# Altium footprint library pcb.PcbLib: 397 footprints (part 8 of 25)
Each footprint in its own frame and in the unit in brackets; x right, y up, seen from the top. Pads: shape width x height; smd on the part's side, far side on the other; paste and mask are expansions set on the pad; w line width, h text height; cw(c..) or ccw(c..) is an arc to the next point about the centre after c.
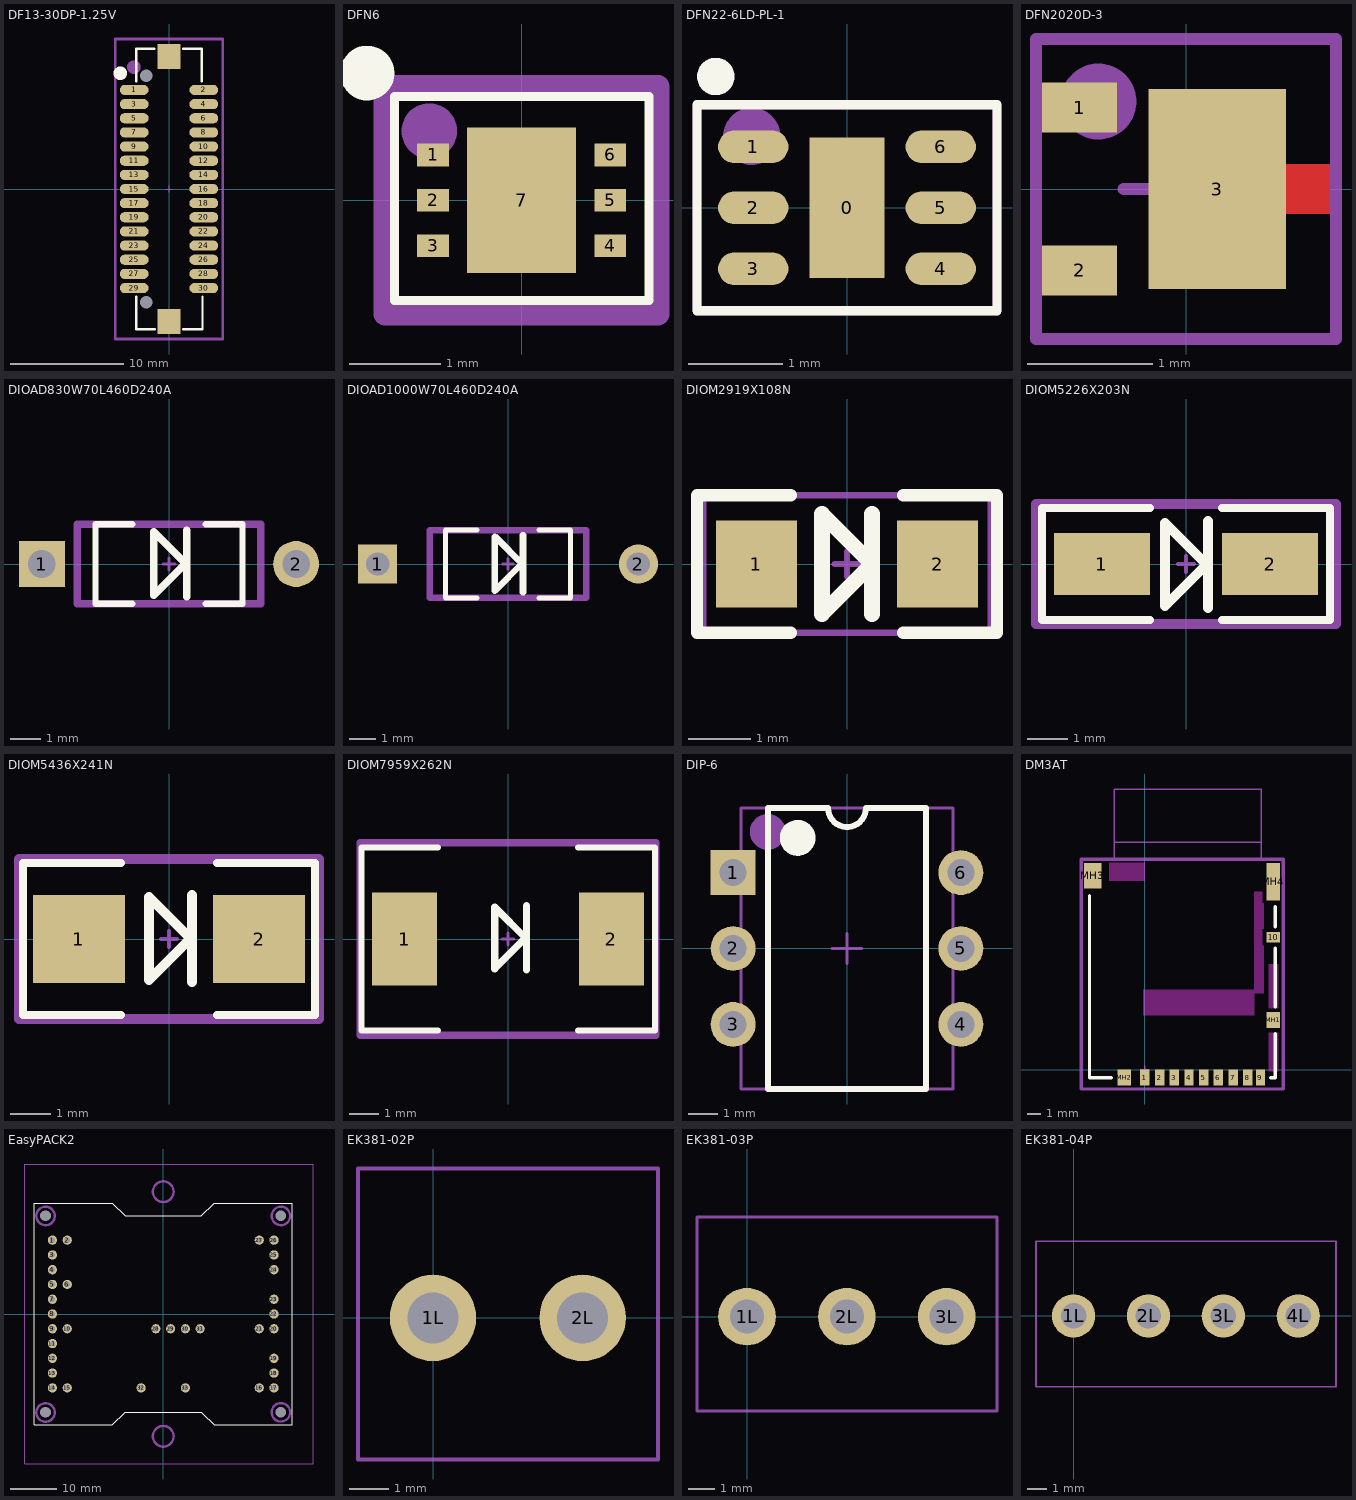
[diagram p7: the footprints below, top view; thin cyan lines are the x and y axes]

## DF13-30DP-1.25V [mm]
height 4.8
pads (34):
  oval 2.55x0.9 smd: 1(-3.075,8.75) 2(3.075,8.75) 3(-3.075,7.5) 4(3.075,7.5) 5(-3.075,6.25) 6(3.075,6.25) 7(-3.075,5) 8(3.075,5) 9(-3.075,3.75) 10(3.075,3.75) 11(-3.075,2.5) 12(3.075,2.5) 13(-3.075,1.25) 14(3.075,1.25) 15(-3.075,0) 16(3.075,0) 17(-3.075,-1.25) 18(3.075,-1.25) 19(-3.075,-2.5) 20(3.075,-2.5) 21(-3.075,-3.75) 22(3.075,-3.75) 23(-3.075,-5) 24(3.075,-5) 25(-3.075,-6.25) 26(3.075,-6.25) 27(-3.075,-7.5) 28(3.075,-7.5) 29(-3.075,-8.75) 30(3.075,-8.75)
  round 0 hole 1.1 unplated: ""(-2,-10) ""(-2,10)
  rect 2x2.2 smd: ""(0,-11.7) ""(0,11.7)
Top Overlay:
  circle w1: c-4.3,10.225 r0.1
  lines w0.2: -2.9,-9.5 -2.9,-12.4 -1.25,-12.4 ; -2.9,9.5 -2.9,12.4 -1.3,12.4 ; 1.25,-12.4 2.95,-12.4 2.95,-9.5 ; 1.25,12.4 2.9,12.4 2.9,9.5
Mechanical 15:
  circle w1: c-3.097,10.77 r0.1
  lines w0.1: -0.3,0 0.3,0 ; 0,-0.3 0,0.3
  lines w0.254: -4.75,-13.25 -4.75,13.25 4.75,13.25 4.75,-13.25 -4.75,-13.25
  text ".Designator" at -0.66,-6.401 h1.02
3D body "DF13-30DP-1.25V.stp": height 4.8, standoff -0.6, extent -3.45,-12.3 3.45,12.3

## DFN6 [mm]
height 2.38
pads (7):
  rect 0.35x0.25 smd paste-0.02 mask+0.07: 1(-0.975,0.5) 2(-0.975,0) 3(-0.975,-0.5) 4(0.975,-0.5) 5(0.975,0) 6(0.975,0.5)
  rect 1.2x1.6 smd paste-50 mask+0.07: 7(0,0)
Top Overlay:
  circle w0.4: c-1.7,1.4 r0.1
  lines w0.1: -1.4,-1.1 -1.4,1.143 1.4,1.143 1.4,-1.1 -1.4,-1.1
Top Paste:
  rectangle: -0.502,-0.711 0.508,-0.108
  rectangle: -0.502,0.102 0.508,0.705
Mechanical 15:
  circle w0.406: c-1.016,0.762 r0.102
  lines w0.1: -0.3,0 0.3,0 ; 0,-0.3 0,0.3
  lines w0.254: -1.5,-1.25 -1.5,1.25 1.5,1.25 1.5,-1.25 -1.5,-1.25
  text ".Designator" at -1.321,-0.965 h0.76
3D body: height 1, standoff 0, extent -1,-1 1,1

## DFN22-6LD-PL-1 [mm]
height 0.85
pads (7):
  rect 0.8x1.5 smd paste-50 mask+0.07: 0(0,0)
  oval 0.75x0.35 smd paste-0.02 mask+0.07: 1(-1,0.65) 2(-1,0) 3(-1,-0.65) 4(1,-0.65) 5(1,0) 6(1,0.65)
Top Overlay:
  circle w0.2: c-1.4,1.4 r0.1
  lines w0.1: -1.6,-1.1 1.6,-1.1 1.6,1.1 -1.6,1.1 -1.6,-1.1
Top Paste:
  rectangle: -0.31,-0.65 0.31,-0.075
  rectangle: -0.31,0.075 0.31,0.65
Mechanical 15:
  circle w0.406: c-1.016,0.762 r0.102
  lines w0.1: -0.3,0 0.3,0 ; 0,-0.3 0,0.3 ; -1.6,-1.1 1.6,-1.1 1.6,1.1 -1.6,1.1 -1.6,-1.1
  text ".Designator" at -1.2,-1 h0.76
3D body: height 0.85, standoff 0, extent -1,-1 1,1

## DFN2020D-3 [mm] "DFN200X200X64-3N"
height 0.65
pads (3):
  rect 0.6x0.4 smd paste-0.1 mask+0.1: 1(-0.85,0.65) 2(-0.85,-0.65)
  rect 1.1x1.6 smd paste-0.1 mask+0.1: 3(0.25,0)
Top Layer:
  region: 0.8,0.2 0.8,-0.2 1.15,-0.2 1.15,0.2
Mechanical 15:
  circle w0.406: c-0.7,0.7 r0.1
  lines w0.1: -0.5,0 0.5,0 ; 0,-0.5 0,0.5 ; -1.2,-1.2 -1.2,1.2 1.2,1.2 1.2,-1.2 -1.2,-1.2
  text ".Designator" at -0.9,-0.8 h0.51
3D body: height 1.1, standoff 0, extent -1,-1 1,1

## DIOAD830W70L460D240A [mm] "DO-41, Diode,Axial;8.30mm C X 0.70mm W 4.60mm L X 2.40mm Dia"
height 2.54
pads (2):
  rect 1.5x1.5 hole 0.9: 1(-4.15,0)
  round 1.5 hole 0.9: 2(4.15,0)
Top Overlay:
  lines w0.2: -1.2,-1.3 -2.4,-1.3 -2.4,1.3 -1.2,1.3 ; 1.2,-1.3 2.4,-1.3 2.4,1.3 1.2,1.3
  lines w0.25: 0.55,0.025 -0.5,-1.025 -0.5,1.05 0.575,-0.025 ; 0.575,-1.075 0.575,1.1
Mechanical 15:
  lines w0.1: -0.2,0 0.2,0 ; 0,-0.2 0,0.2
  lines w0.254: -3,-1.3 -3,1.3 3,1.3 3,-1.3 -3,-1.3
  text ".Designator" at -2.7,-1 h1.02
  text "A" at -4.5,1 h1.02
  text "K" at 3.8,1 h1.02
3D body: height 3.29, standoff 0.7, extent -2.4,-1.297 2.4,1.297

## DIOAD1000W70L460D240A [mm] "DO-41, Diode,Axial;8.30mm C X 0.70mm W 4.60mm L X 2.40mm Dia"
height 2.54
pads (2):
  rect 1.5x1.5 hole 0.9: 1(-5,0)
  round 1.5 hole 0.9: 2(5,0)
Top Overlay:
  lines w0.2: -1.2,-1.3 -2.4,-1.3 -2.4,1.3 -1.2,1.3 ; 1.2,-1.3 2.4,-1.3 2.4,1.3 1.2,1.3
  lines w0.25: 0.55,0.025 -0.5,-1.025 -0.5,1.05 0.575,-0.025 ; 0.575,-1.075 0.575,1.1
Mechanical 15:
  lines w0.1: -0.2,0 0.2,0 ; 0,-0.2 0,0.2
  lines w0.254: -3,-1.3 3,-1.3 3,1.3 -3,1.3 -3,-1.3
  text "K" at 4.7,1 h1.02
  text "A" at -5.4,0.9 h1.02
  text ".Designator" at -2.7,-1 h1.02
3D body: height 3.29, standoff 0.7, extent -2.4,-1.297 2.4,1.297

## DIOM2919X108N [mm] "DO-219-AB/SMF; 2 C-Bend Leads; Body 2.9 x 1.9 mm"
height 1.08
pads (2):
  rect 1.3x1.4 smd: 1(-1.45,0) 2(1.45,0)
Top Overlay:
  lines w0.2: -0.9,-1.1 -2.4,-1.1 -2.4,1.1 -0.9,1.1 ; 0.9,-1.1 2.4,-1.1 2.4,1.1 0.9,1.1
  lines w0.25: 0.4,-0.8 0.4,0.8 ; -0.4,-0.8 -0.4,0.8 0.4,0 -0.4,-0.8
Mechanical 15:
  lines w0.1: -0.2,0 0.2,0 ; 0,-0.2 0,0.2 ; -2.3,-1.1 -2.3,1.1 2.3,1.1 2.3,-1.1 -2.3,-1.1
  text ".Designator" at -2.1,-0.9 h1.02
  text "A" at -1.8,1.3 h1.02
  text "K" at 1.2,1.3 h1.02
3D body: height 2.03, standoff 0, extent -1.5,-1 1.5,1

## DIOM5226X203N [mm] "DO-214-AC/SMA; 2 C-Bend Leads; Body 5.3 x 2.6 mm, inc. leads (LxW)"
height 2.34
pads (2):
  rect 2.4x1.55 smd: 1(-2.1,0) 2(2.1,0)
Top Overlay:
  lines w0.2: -0.9,-1.4 -3.6,-1.4 -3.6,1.4 -0.9,1.4 ; 0.9,-1.4 3.6,-1.4 3.6,1.4 0.9,1.4
  lines w0.25: 0.525,0 -0.525,-1.05 -0.525,1.025 0.55,-0.05 ; 0.55,-1.1 0.55,1.075
Mechanical 15:
  lines w0.1: -0.2,0 0.2,0 ; 0,-0.2 0,0.2
  lines w0.254: -3.75,-1.5 -3.75,1.5 3.75,1.5 3.75,-1.5 -3.75,-1.5
  text ".Designator" at -3.454,-1.067 h1.02
  text "A" at -3.099,0.203 h1.02
  text "K" at 2.54,0.203 h1.02
3D body: height 2.03, standoff 0, extent -2.7,-1.3 2.7,1.3

## DIOM5436X241N [mm] "DO-214-AA/SMB; 2 C-Bend Leads; Body 5.3 x 3.6 mm, inc. leads (LxW)"
height 2.54
pads (2):
  rect 2.3x2.2 smd: 1(-2.25,0) 2(2.25,0)
Top Overlay:
  lines w0.2: -1.2,-1.9 -3.65,-1.9 -3.65,1.9 -1.2,1.9 ; 1.2,-1.9 3.65,-1.9 3.65,1.9 1.2,1.9
  lines w0.25: 0.55,0.025 -0.5,-1.025 -0.5,1.05 0.575,-0.025 ; 0.575,-1.075 0.575,1.1
Mechanical 15:
  lines w0.1: -0.2,0 0.2,0 ; 0,-0.2 0,0.2
  lines w0.254: -3.75,-2 3.75,-2 3.75,2 -3.75,2 -3.75,-2
  text "K" at 2.489,0.61 h1.02
  text "A" at -3.15,0.61 h1.02
  text ".Designator" at -3.404,-1.422 h1.02
3D body: height 2.41, standoff 0, extent -2.7,-1.8 2.7,1.8

## DIOM7959X262N [mm] "DO-214-AB/SMC; 2 C-Bend Leads; Body 7.9 x 5.9 mm, inc. leads (LxW)"
height 2.57
pads (2):
  rect 2.2x3.15 smd: 1(-3.5,0) 2(3.5,0)
Top Overlay:
  lines w0.2: -2.375,-3.1 -4.95,-3.1 -4.95,3.1 -2.375,3.1 ; 2.375,-3.1 4.975,-3.1 4.975,3.1 2.375,3.1
  lines w0.25: 0.6,0.05 -0.45,-1 -0.45,1.075 0.625,0 ; 0.625,-1.05 0.625,1.125
Mechanical 15:
  lines w0.1: -0.2,0 0.2,0 ; 0,-0.2 0,0.2
  lines w0.254: -5,-3.25 5,-3.25 5,3.25 -5,3.25 -5,-3.25
  text "K" at 2.489,1.473 h1.02
  text "A" at -3.15,1.473 h1.02
  text ".Designator" at -4.115,-2.083 h1.02
3D body: height 2.62, standoff 0, extent -4,-3 4,3

## DIP-6 [mm] "DIP, 6-Pin, Row Spacing 7.62 mm, Pitch 2.54 mm"
height 5.46
pads (6):
  rect 1.5x1.5 hole 0.9: 1(-3.81,2.54)
  round 1.5 hole 0.9: 2(-3.81,0) 3(-3.81,-2.54) 4(3.81,-2.54) 5(3.81,0) 6(3.81,2.54)
Top Overlay:
  circle w0.6: c-1.65,3.7 r0.3
  lines w0.2: -2.65,-4.7 -2.65,4.7 -0.635,4.7 ccw(c0,4.7) 0.635,4.7 2.65,4.7 2.65,-4.7 -2.65,-4.7
Mechanical 15:
  circle w0.6: c-2.65,3.9 r0.3
  lines w0.1: -0.5,0 0.5,0 ; 0,-0.5 0,0.5 ; -3.55,-4.7 -3.55,4.7 3.55,4.7 3.55,-4.7 -3.55,-4.7
3D body: height 5.46, standoff 0, extent -3.55,-4.7 3.55,4.7

## DM3AT [mm] "Hirose DM3AT Connector"
height 1.75
pads (14):
  rect 0.7x1.2 smd: 1(0,-0.6) 2(1.1,-0.6) 3(2.2,-0.6) 4(3.3,-0.6) 5(4.4,-0.6) 6(5.5,-0.6) 7(6.6,-0.6) 8(7.7,-0.6) 9(8.65,-0.6)
  rect 1x0.8 smd: 10(9.6,9.9)
  rect 1x1.2 smd: MH1(9.6,3.7) MH2(-1.55,-0.6)
  rect 1.3x1.9 smd: MH3(-3.9,14.5)
  rect 1x2.8 smd: MH4(9.6,14.05)
Top Layer keep-out:
  region: 0,15.5 -2.7,15.5 -2.7,14.1 0,14.1
  region: 8.2,6 -0.15,6 -0.15,4.064 8.2,4.064
  region: 10,7.9 9.25,7.9 9.25,4.572 10,4.572
  region: 10,2.794 9.25,2.794 9.25,-0.15 10,-0.15
  region: 8.2,5.7 8.9,5.7 8.9,9.271 8.763,9.271 8.763,10.541 8.9,10.541 8.9,12.446 8.763,12.446 8.763,13.3 8.2,13.3
Top Overlay:
  lines w0.254: -4.15,13 -4.15,-0.6 -2.5,-0.6 ; 9.4,-0.6 9.75,-0.6 9.75,2.7 ; 9.75,4.7 9.75,9.1 ; 9.75,10.7 9.75,12.2
Mechanical 15:
  lines w0.1: -2.3,15.75 -2.3,21 8.7,21 8.7,15.75 ; -2.3,17 8.7,17 ; -0.3,0 0.3,0 ; 0,-0.3 0,0.3
  lines w0.254: -4.75,-1.45 -4.75,15.75 10.35,15.75 10.35,-1.45 -4.75,-1.45
  text "ejected" at 0.1,21.3 h1.02
  text "locked" at 0.7,17.3 h1.02
  text ".Designator" at -3.099,1.93 h1.02
3D body: height 1.45, standoff 0.65, extent -2.4,2 8.8,17
3D body: height 1.4, standoff 0.7, extent -2.3,6 8.7,21
3D body "DM3AT-SF-PEJM5.stp": height 1.68, standoff 0, extent -4.125,-0.6 9.725,15.55

## EasyPACK2 [mm] "EasyPACK 4 IGBT & Press FIT"
pads (37):
  round 2 hole 1.15: 1(-24,16) 2(-20.8,16) 3(-24,12.8) 4(-24,9.6) 5(-24,6.4) 6(-20.8,6.4) 7(-24,3.2) 8(-24,0) 9(-24,-3.2) 10(-20.8,-3.2) 11(-24,-6.4) 12(-24,-9.6) 13(-24,-12.8) 14(-24,-16) 15(-20.8,-16) 16(20.8,-16) 17(24,-16) 18(24,-12.8) 19(24,-9.6) 20(24,-3.2) 21(20.8,-3.2) 22(24,0) 23(24,3.2) 24(24,9.6) 25(24,12.8) 26(24,16) 27(20.8,16) 28(-1.6,-3.2) 29(1.6,-3.2) 30(4.8,-3.2) 31(8,-3.2) 32(-4.8,-16) 33(4.8,-16)
  round 0 hole 2.3 unplated: 34(-25.5,21.3) 35(-25.5,-21.3) 36(25.5,-21.3) 37(25.5,21.3)
Top Overlay:
  lines w0.254: -28,-24 -11,-24 -8.2,-21.25 8.25,-21.25 8.5,-21.5 11,-24 28,-24 28,24 11,24 8.2,21.25 -8.2,21.25 -11,24 -28,24 -28,-24
Mechanical 15:
  circle w0.508: c-25.5,21.25 r2
  circle w0.508: c-25.5,-21.35 r2
  circle w0.508: c25.5,-21.3 r2
  circle w0.508: c25.5,21.25 r2
  circle w0.508: c0,26.5 r2.25
  circle w0.508: c0,-26.5 r2.25
  lines w0.254: -30,24.5 -30,32.5 32.5,32.5 32.5,-32.5 -30,-32.5 -30,25
  text ".Designator" at -2.3,-7.1 h1.02
3D body "User Library-FS75R12W2T4.STEP": height 2.5, standoff -13, extent -28.35,-31.4 28.35,31.4

## EK381-02P [mm]
height 16.2
pads (2):
  round 2.2 hole 1.3: 1L(0,0) 2L(3.81,0)
Mechanical 15:
  lines w0.1: -0.3,0 0.3,0 ; 0,-0.3 0,0.3 ; -1.91,-3.6 -1.91,3.8 5.73,3.8 5.73,-3.6 -1.91,-3.6
  text ".Designator" at -1.3,-2.9 h1.02
3D body "EK381-02P.stp": height 8.5, standoff -3.5, extent -1.91,-3.6 5.71,3.8

## EK381-03P [mm]
height 16.2
pads (3):
  round 2.2 hole 1.3: 1L(0,0) 2L(3.81,0) 3L(7.62,0)
Mechanical 15:
  lines w0.1: -0.3,0 0.3,0 ; 0,-0.3 0,0.3 ; -1.91,-3.6 9.54,-3.6 9.54,3.8 -1.91,3.8 -1.91,-3.6
  text ".Designator" at -1.3,-2.9 h1.02
3D body "EK381-02P.stp": height 8.5, standoff -3.5, extent -1.91,-3.6 5.71,3.8
3D body "EK381-02P.stp": height 8.5, standoff -3.5, extent 1.9,-3.6 9.52,3.8

## EK381-04P [mm]
height 16.2
pads (4):
  round 2.2 hole 1.3: 1L(0,0) 2L(3.81,0) 3L(7.62,0) 4L(11.43,0)
Mechanical 15:
  lines w0.1: -0.3,0 0.3,0 ; 0,-0.3 0,0.3 ; 5.71,-3.6 13.35,-3.6 13.35,3.8 5.71,3.8 ; 5.73,-3.6 -1.91,-3.6 -1.91,3.8 5.73,3.8
  text ".Designator" at -1.3,-2.9 h1.02
3D body "EK381-02P.stp": height 8.5, standoff -3.5, extent -1.91,-3.6 5.71,3.8
3D body "EK381-02P.stp": height 8.5, standoff -3.5, extent 5.71,-3.6 13.33,3.8